# Altium footprint library MS-Electronic.PcbLib: 213 footprints (part 4 of 14)
Each footprint in its own frame and in the unit in brackets; x right, y up, seen from the top. Pads: shape width x height; smd on the part's side, far side on the other; paste and mask are expansions set on the pad; w line width, h text height; cw(c..) or ccw(c..) is an arc to the next point about the centre after c.
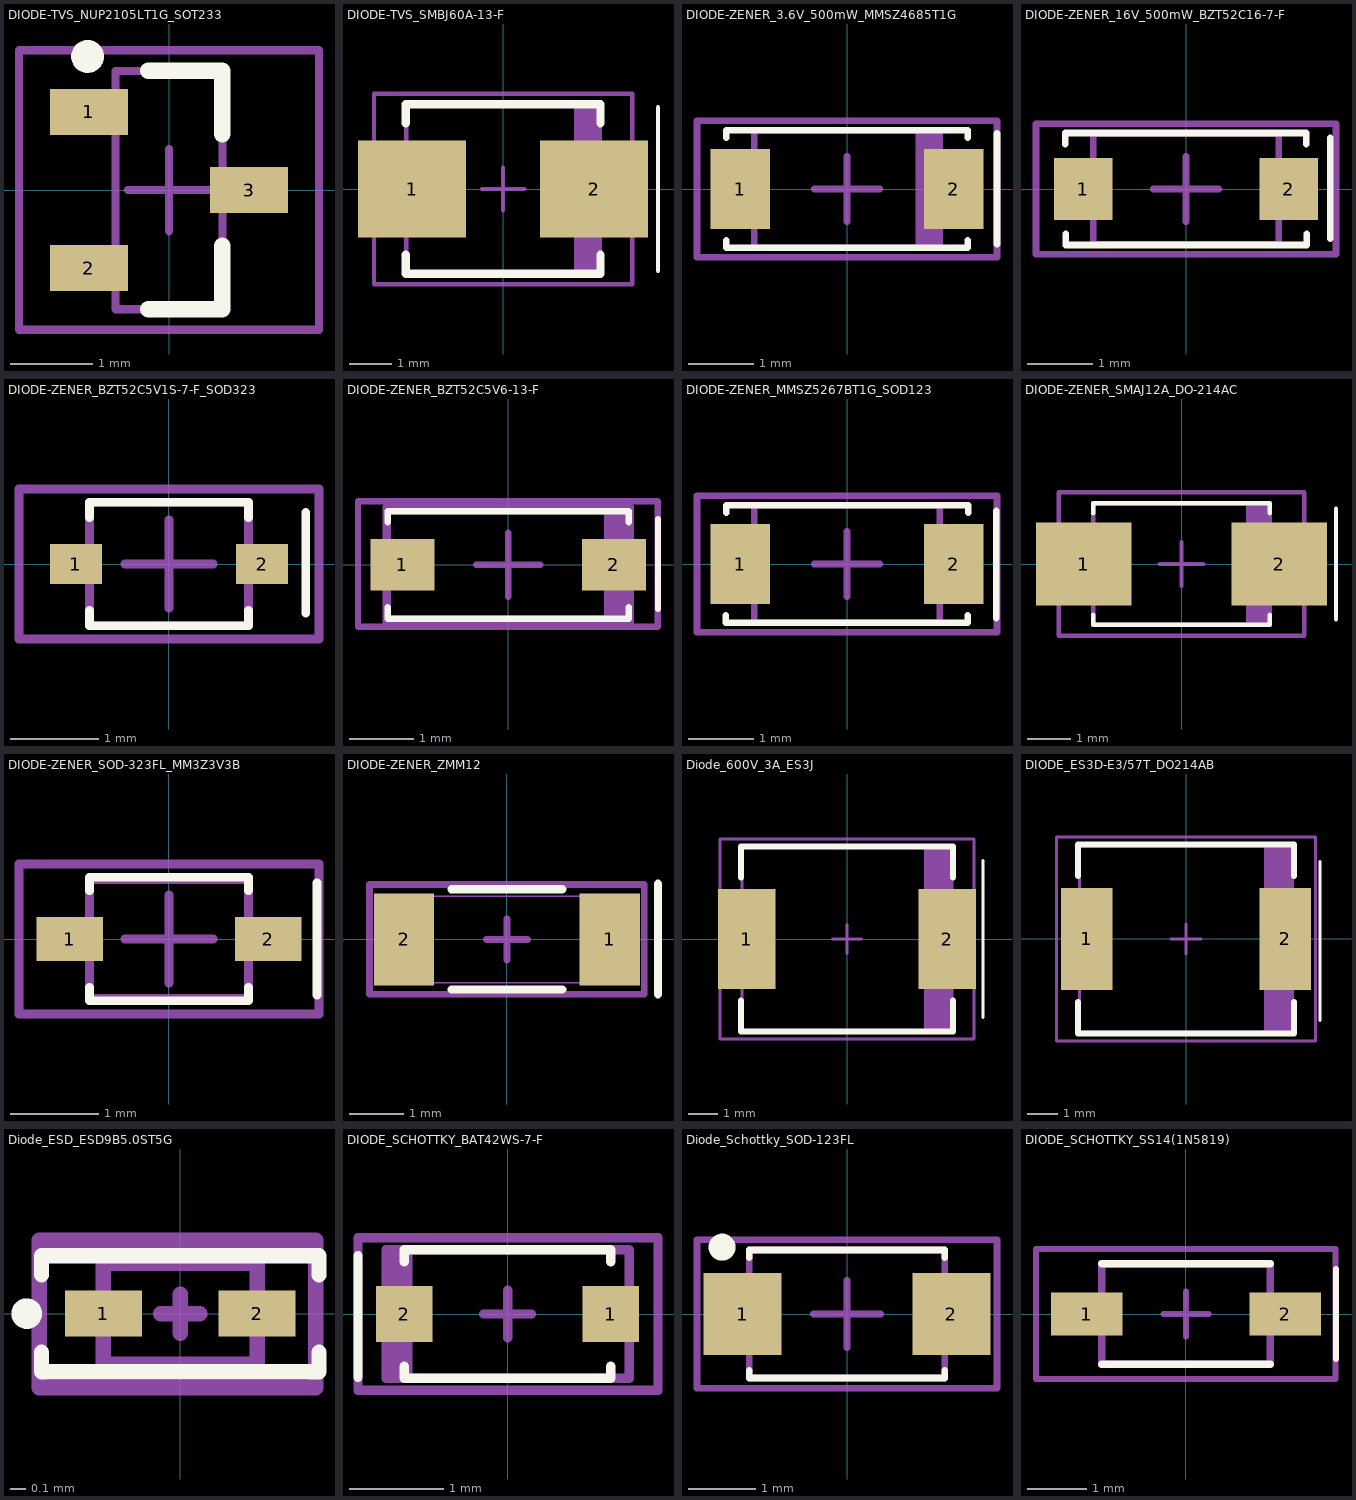
[diagram p3: the footprints below, top view; thin cyan lines are the x and y axes]

## DIODE-TVS_NUP2105LT1G_SOT233 [mm]
height 1
pads (3):
  rect 0.95x0.56 smd: 1(-0.975,0.95) 2(-0.975,-0.95) 3(0.975,0)
Top Overlay:
  circle w0.2: c-0.991,1.626 r0.1
  lines w0.2: -0.25,-1.45 0.65,-1.45 0.65,-0.68 ; -0.25,1.45 0.65,1.45 0.65,0.68
Top Assembly:
  lines w0.1: -0.65,-1.45 -0.65,1.45 0.65,1.45 0.65,-1.45 -0.65,-1.45
  text ".Designator" at -2.499,-0.167 h0.5
Top Component Center (Mech15):
  lines w0.1: -0.5,0 0.5,0 ; 0,-0.5 0,0.5 ; -1.825,-1.7 -1.825,1.7 1.825,1.7 1.825,-1.7 -1.825,-1.7
3D body "DIODE-TVS_NUP2105LT1G_SOT233.step": height 1, standoff 0, extent -1.2,-1.45 1.2,1.45

## DIODE-TVS_SMBJ60A-13-F [mm]
height 2.5
pads (2):
  rect 2.55x2.3 smd: 1(-2.15,0) 2(2.15,0)
Top Overlay:
  lines w0.1: 3.658,-1.93 3.658,1.93
  lines w0.2: -2.3,-1.55 -2.3,-2 2.3,-2 2.3,-1.55 ; -2.3,1.55 -2.3,2 2.3,2 2.3,1.55
Top Assembly:
  rectangle: 1.67,-1.97 2.285,1.97
  lines w0.1: -2.285,-1.97 -2.285,1.97 2.285,1.97 2.285,-1.97 -2.285,-1.97
  text ".Designator" at -2.499,-0.167 h0.5
Top Component Center (Mech15):
  lines w0.1: -0.5,0 0.5,0 ; 0,-0.5 0,0.5 ; -3.05,-2.25 -3.05,2.25 3.05,2.25 3.05,-2.25 -3.05,-2.25
3D body "DIODE-TVS_SMBJ60A-13-F.step": height 2.5, standoff 0, extent -2.505,-1.97 2.505,1.97

## DIODE-ZENER_3.6V_500mW_MMSZ4685T1G [mm]
height 1.35
pads (2):
  rect 0.91x1.22 smd: 1(-1.635,0) 2(1.635,0)
Top Overlay:
  lines w0.1: -1.854,0.786 -1.854,0.901 1.853,0.901 1.853,0.786 ; -1.852,-0.786 -1.852,-0.901 -1.853,-0.901 1.854,-0.901 1.854,-0.786 ; 2.3,-0.847 2.3,0.851
Top Assembly:
  rectangle: 1.048,-0.9 1.42,0.9
  lines w0.1: -1.42,-0.9 -1.42,0.9 1.42,0.9 1.42,-0.9 -1.42,-0.9
  text ".Designator" at -2.499,-0.167 h0.5
Top Component Center (Mech15):
  lines w0.1: -0.5,0 0.5,0 ; 0,-0.5 0,0.5 ; -2.3,-1.05 -2.3,1.05 2.3,1.05 2.3,-1.05 -2.3,-1.05
3D body "DIODE-ZENER_3.6V_500mW_MMSZ4685T1G.step": height 1.35, standoff 0, extent -1.855,-0.9 1.855,0.9

## DIODE-ZENER_16V_500mW_BZT52C16-7-F [mm]
height 1.35
pads (2):
  rect 0.9x0.95 smd: 1(-1.575,0) 2(1.575,0)
Top Overlay:
  lines w0.1: -1.854,0.686 -1.854,0.859 1.847,0.859 1.847,0.686 ; -1.847,-0.686 -1.847,-0.859 1.854,-0.859 1.854,-0.686 ; 2.21,-0.762 2.21,0.787
Top Assembly:
  lines w0.1: -1.425,-0.85 -1.425,0.85 1.425,0.85 1.425,-0.85 -1.425,-0.85
  text ".Designator" at -2.499,-0.167 h0.5
Top Component Center (Mech15):
  lines w0.1: -0.5,0 0.5,0 ; 0,-0.5 0,0.5 ; -2.3,-1 -2.3,1 2.3,1 2.3,-1 -2.3,-1
3D body "DIODE-ZENER_16V_500mW_BZT52C16-7-F.step": height 1.35, standoff 0, extent -1.85,-0.85 1.85,0.85

## DIODE-ZENER_BZT52C5V1S-7-F_SOD323 [mm]
height 1.2
pads (2):
  rect 0.59x0.45 smd: 1(-1.055,0) 2(1.055,0)
Top Overlay:
  lines w0.1: -0.9,-0.525 -0.9,-0.7 0.9,-0.7 0.9,-0.525 ; -0.9,0.525 -0.9,0.7 0.9,0.7 0.9,0.525 ; 1.549,-0.559 1.549,0.584
Top Assembly:
  lines w0.1: -0.9,-0.7 0.9,-0.7 0.9,0.7 -0.9,0.7 -0.9,-0.7
  text ".Designator" at -1.999,-0.133 h0.4
Top Component Center (Mech15):
  lines w0.1: -0.5,0 0.5,0 ; 0,-0.5 0,0.5 ; -1.7,-0.85 1.7,-0.85 1.7,0.85 -1.7,0.85 -1.7,-0.85
3D body "DIODE-ZENER_BZT52C5V1S-7-F_SOD323.step": height 1.2, standoff 0, extent -1.25,-0.7 1.25,0.7

## DIODE-ZENER_BZT52C5V6-13-F [mm]
pads (2):
  rect 1x0.8 smd mask+0.1: 1(-1.65,0) 2(1.65,0)
Top Overlay:
  lines w0.1: -1.882,0.663 -1.882,0.838 1.881,0.838 1.881,0.663 ; -1.881,-0.663 -1.881,-0.838 1.882,-0.838 1.882,-0.663 ; -1.88,-0.838 -1.879,-0.838 ; 1.879,0.838 1.88,0.838 ; 2.337,-0.686 2.337,0.711
Top Assembly:
  rectangle: 1.499,-0.838 1.88,0.838
  lines w0.1: -1.88,-0.838 -1.88,0.838 1.88,0.838 1.88,-0.838 -1.88,-0.838
  text ".Designator" at -2.499,-0.167 h0.5
Top Component Center (Mech15):
  lines w0.1: -0.5,0 0.5,0 ; 0,-0.5 0,0.5 ; -2.343,-0.965 2.334,-0.965 2.334,0.991 -2.343,0.991 -2.343,-0.965
Mechanical 38:
  region: 1.9,0.9 1.9,-0.9 1.5,-0.9 1.5,0.9
  lines w0.127: -1.9,-0.9 -1.9,0.9 1.9,0.9 1.9,-0.9 -1.9,-0.9
3D body "sod123 v4.step": height 1.2, standoff 0, extent -1.875,-0.85 1.875,0.85

## DIODE-ZENER_MMSZ5267BT1G_SOD123 [mm]
height 1.16
pads (2):
  rect 0.91x1.22 smd: 1(-1.635,0) 2(1.635,0)
Top Overlay:
  lines w0.1: -1.857,-0.785 -1.857,-0.9 ; -1.854,0.785 -1.854,0.9 1.856,0.9 ; 1.854,-0.785 1.854,-0.9 -1.856,-0.9 ; 1.857,0.785 1.857,0.9 ; 2.286,-0.831 2.286,0.814 ; -1.857,-0.9 -1.856,-0.9 ; 1.856,0.9 1.857,0.9
Top Assembly:
  lines w0.1: -1.42,-0.9 1.42,-0.9 1.42,0.9 -1.42,0.9 -1.42,-0.9
  text ".Designator" at -2.499,-0.167 h0.5
Top Component Center (Mech15):
  lines w0.1: -0.5,0 0.5,0 ; 0,-0.5 0,0.5 ; -2.3,-1.05 2.3,-1.05 2.3,1.05 -2.3,1.05 -2.3,-1.05
3D body "DIODE-ZENER_MMSZ5267BT1G_SOD123.step": height 1.16, standoff 0, extent -1.855,-0.9 1.855,0.9

## DIODE-ZENER_SMAJ12A_DO-214AC [mm]
height 2.29
pads (2):
  rect 2.2x1.9 smd: 1(-2.25,0) 2(2.25,0)
Top Overlay:
  lines w0.1: -2.032,1.168 -2.03,1.168 -2.03,1.395 2.03,1.395 2.03,1.168 ; -2.03,-1.168 -2.03,-1.395 2.03,-1.395 2.03,-1.168 2.032,-1.168 ; 3.556,-1.27 3.556,1.27
Top Assembly:
  rectangle: 1.484,-1.395 2.03,1.395
  lines w0.1: -2.03,-1.395 2.03,-1.395 2.03,1.395 -2.03,1.395 -2.03,-1.395
  text ".Designator" at -2.499,-0.167 h0.5
Top Component Center (Mech15):
  lines w0.1: -0.5,0 0.5,0 ; 0,-0.5 0,0.5 ; -2.825,-1.65 2.825,-1.65 2.825,1.65 -2.825,1.65 -2.825,-1.65
3D body "DIODE-ZENER_SMAJ12A_DO-214AC.step": height 2.29, standoff 0, extent -2.25,-1.4 2.25,1.39

## DIODE-ZENER_SOD-323FL_MM3Z3V3B [mm]
height 0.9
pads (2):
  rect 0.75x0.5 smd: 1(-1.125,0) 2(1.125,0)
Top Overlay:
  lines w0.1: -0.9,-0.55 -0.9,-0.7 0.9,-0.7 0.9,-0.55 ; -0.9,0.55 -0.9,0.7 0.9,0.7 0.9,0.55 ; 1.676,-0.635 1.678,0.635
Top Assembly:
  lines w0.1: -0.9,-0.675 0.9,-0.675 0.9,0.675 -0.9,0.675 -0.9,-0.675
  text ".Designator" at -1.999,-0.133 h0.4
Top Component Center (Mech15):
  lines w0.1: -0.5,0 0.5,0 ; 0,-0.5 0,0.5 ; -1.7,-0.85 1.7,-0.85 1.7,0.85 -1.7,0.85 -1.7,-0.85
3D body "DIODE-ZENER_SOD-323FL_MM3Z3V3B.step": height 0.9, standoff 0, extent -1.25,-0.675 1.25,0.675

## DIODE-ZENER_ZMM12 [mm]
pads (2):
  rect 1.113x1.702 smd paste+0: 1(1.903,0) 2(-1.903,0)
Top Overlay:
  lines w0.152: -1.023,-0.927 1.023,-0.927 ; -1.023,0.927 1.023,0.927 ; 2.794,-1.016 2.794,1.03
Top Assembly:
  lines w0.127: -2.54,-1.016 2.54,-1.016 2.54,1.016 -2.54,1.016 -2.54,-1.016
  text "'.Designator'" at -3.686,-0.345 h1.52
Top 3D Body:
  lines w0.025: -1.85,-0.8 -1.85,0.8 1.85,0.8 1.85,-0.8 -1.85,-0.8
Top Component Center (Mech15):
  lines w0.127: -0.381,0 0,0 ; 0,-0.381 0,0 ; 0,0.381 0,0 ; 0.381,0 0,0 ; -2.54,-1.016 2.54,-1.016 2.54,1.016 -2.54,1.016 -2.54,-1.016
3D body "SOD80C_NXP.step": height 1.6, standoff 0, extent -1.85,-0.794 1.85,0.794

## Diode_600V_3A_ES3J [mm]
height 2.65
pads (2):
  rect 1.96x3.39 smd: 1(-3.405,0) 2(3.405,0)
Top Overlay:
  lines w0.1: 4.623,-2.662 4.623,2.672
  lines w0.2: -3.6,-2.095 -3.6,-3.15 3.6,-3.15 3.6,-2.095 ; -3.6,2.095 -3.6,3.15 3.6,3.15 3.6,2.095
Top Assembly:
  rectangle: 2.613,-3.125 3.575,3.125
  lines w0.1: -3.575,-3.125 3.575,-3.125 3.575,3.125 -3.575,3.125 -3.575,-3.125
  text ".Designator" at -2.499,-0.167 h0.5
Top Component Center (Mech15):
  lines w0.1: -0.5,0 0.5,0 ; 0,-0.5 0,0.5 ; -4.325,-3.4 4.325,-3.4 4.325,3.4 -4.325,3.4 -4.325,-3.4
3D body "Diode-Zenner_600V_3A_ES3J.step": height 2.65, standoff 0, extent -3.795,-3.125 3.795,3.125

## DIODE_ES3D-E3/57T_DO214AB [mm]
height 2.62
pads (2):
  rect 1.72x3.4 smd: 1(-3.305,0) 2(3.305,0)
Top Overlay:
  lines w0.1: 4.47,-2.718 4.47,2.591
  lines w0.2: -3.6,-2.1 -3.6,-3.15 3.6,-3.15 3.6,-2.1 ; -3.6,2.1 -3.6,3.15 3.6,3.15 3.6,2.1
Top Assembly:
  rectangle: 2.599,-3.11 3.555,3.11
  lines w0.1: -3.555,-3.11 -3.555,3.11 3.555,3.11 3.555,-3.11 -3.555,-3.11
  text ".Designator" at -2.499,-0.167 h0.5
Top Component Center (Mech15):
  lines w0.1: -0.5,0 0.5,0 ; 0,-0.5 0,0.5 ; -4.325,-3.4 -4.325,3.4 4.325,3.4 4.325,-3.4 -4.325,-3.4
3D body "SMC_nominal.stp": height 2.32, standoff 0.02, extent -3.975,-2.95 3.975,2.95

## Diode_ESD_ESD9B5.0ST5G [mm]
height 0.4
pads (2):
  rect 0.5x0.3 smd: 1(-0.5,0) 2(0.5,0)
Top Overlay:
  circle w0.1: c-1,0 r0.05
  lines w0.1: -0.903,-0.252 -0.903,-0.377 -0.633,-0.377 0.903,-0.377 0.903,-0.252 ; -0.903,0.252 -0.903,0.377 0.633,0.377 0.903,0.377 0.903,0.252
Top Assembly:
  lines w0.1: -0.502,-0.329 -0.502,0.329 0.501,0.329 0.501,-0.329 -0.502,-0.329
  text ".Designator" at -1.5,-0.1 h0.3
Top Component Center (Mech15):
  lines w0.1: -0.127,0 0,0 ; 0,-0.127 0,0 ; 0,0.127 0,0 ; 0.127,0 0,0 ; -0.917,-0.483 -0.917,0.479 0.883,0.479 0.883,-0.483 -0.917,-0.483
3D body "Diode_ESD_ESD9B5.0ST5G.step": height 0.4, standoff 0, extent -0.5,-0.325 0.5,0.325

## DIODE_SCHOTTKY_BAT42WS-7-F [mm]
pads (2):
  rect 0.6x0.6 smd paste-0.05: 1(1.1,0) 2(-1.1,0)
Top Overlay:
  lines w0.1: -1.594,-0.672 -1.594,0.624 ; -1.1,-0.555 -1.1,-0.686 1.1,-0.686 1.1,-0.555 ; -1.1,0.555 -1.1,0.686 1.1,0.686 1.1,0.555
Top Assembly:
  text ".Designator" at -2.499,-0.167 h0.5
Top 3D Body:
  rectangle: -1.295,-0.686 -1.016,0.686
  lines w0.1: -1.295,-0.686 -1.295,0.686 1.295,0.686 1.295,-0.686 -1.295,-0.686
Top Component Center (Mech15):
  lines w0.1: -0.254,0 0,0 ; 0,-0.254 0,0 ; 0,0.254 0,0 ; 0.254,0 0,0 ; -1.594,-0.813 -1.594,0.813 1.603,0.813 1.603,-0.813 -1.594,-0.813
3D body "SOD-323.stp": height 1.1, standoff 0, extent -1.3,-0.675 1.3,0.675

## Diode_Schottky_SOD-123FL [mm]
height 1.1
pads (2):
  rect 1.15x1.22 smd: 1(-1.55,0) 2(1.55,0)
Top Overlay:
  circle w0.3: c-1.854,0.991 r0.05
  lines w0.1: -1.45,-0.836 -1.45,-0.95 1.45,-0.95 ; -1.45,0.836 -1.45,0.95 ; -1.448,0.95 -1.45,0.95 ; 1.448,-0.95 1.45,-0.95 ; 1.45,-0.836 1.45,-0.95 ; 1.45,0.836 1.45,0.95 -1.45,0.95
Top Assembly:
  lines w0.1: -1.45,-0.95 1.45,-0.95 1.45,0.95 -1.45,0.95 -1.45,-0.95
  text ".Designator" at -2.999,-0.2 h0.6
Top Component Center (Mech15):
  lines w0.1: -0.5,0 0.5,0 ; 0,-0.5 0,0.5 ; -2.225,-1.1 2.225,-1.1 2.225,1.1 -2.225,1.1 -2.225,-1.1
3D body "Diode_Schottky_SOD-123FL.step": height 1.1, standoff 0, extent -1.8,-0.95 1.8,0.95

## DIODE_SCHOTTKY_SS14(1N5819) [mm]
pads (2):
  rect 1.21x0.73 smd: 1(-1.68,0) 2(1.68,0)
Top Overlay:
  lines w0.1: 2.54,-0.762 2.54,0.762
  lines w0.127: -1.425,-0.85 1.425,-0.85 ; -1.425,0.85 1.425,0.85
Top Assembly:
  lines w0.1: 2.54,-0.762 2.54,0.762
  lines w0.127: -1.425,-0.85 -1.425,0.85 1.425,0.85 1.425,-0.85 -1.425,-0.85
  text ".Designator" at -2.999,-0.2 h0.6
Top Component Center (Mech15):
  lines w0.1: -0.381,0 0,0 ; 0,-0.381 0,0 ; 0,0.381 0,0 ; 0.381,0 0,0 ; -2.535,-1.1 2.535,-1.1 2.535,1.1 -2.535,1.1 -2.535,-1.1
3D body "step_temp.STEP": height 1.5, standoff -0.03, extent -1.825,-0.775 1.825,0.775